# Altium footprint library LED.PcbLib: 60 footprints (part 4 of 4)
Each footprint in its own frame and in the unit in brackets; x right, y up, seen from the top. Pads: shape width x height; smd on the part's side, far side on the other; paste and mask are expansions set on the pad; w line width, h text height; cw(c..) or ccw(c..) is an arc to the next point about the centre after c.
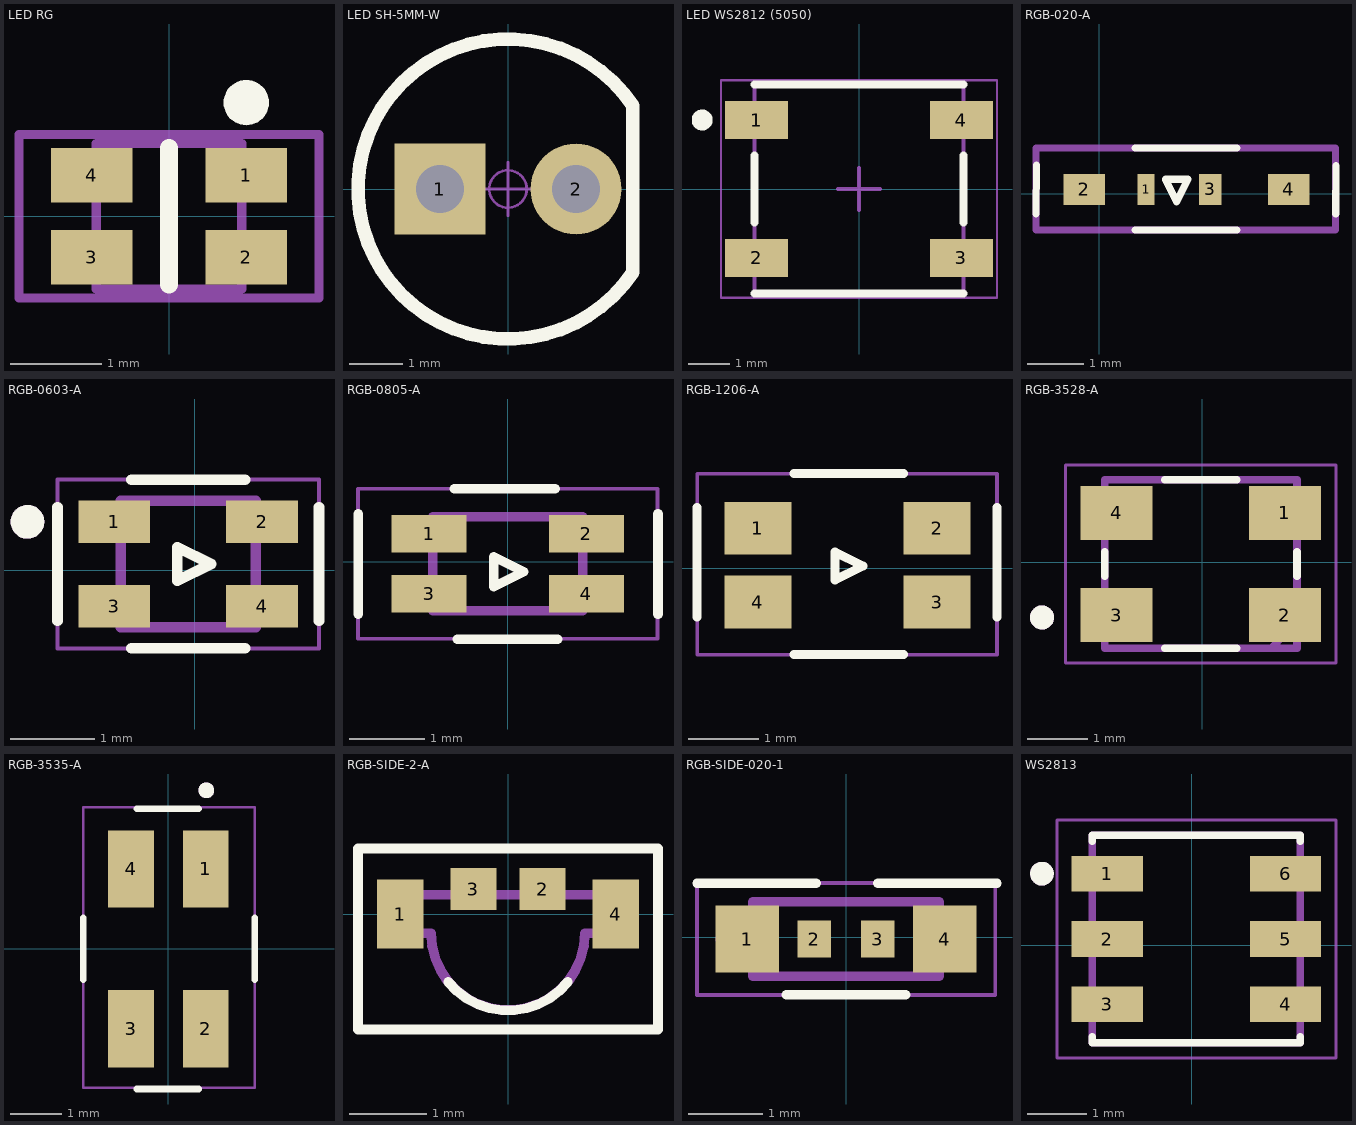
[diagram p3: the footprints below, top view; thin cyan lines are the x and y axes]

## LED RG [mm]
pads (5):
  rect 0.9x0.6 smd: 1(0.85,0.45) 2(0.85,-0.45) 3(-0.85,-0.45) 4(-0.85,0.45)
  round 0.5 on Top Overlay: ""(0.85,1.25)
Top Overlay:
  lines w0.2: 0,-0.75 0,0.75
Mechanical 1:
  lines w0.1: -0.8,0.8 0.8,0.8 ; -0.8,0.8 -0.8,-0.8 0.8,-0.8 ; -0.8,0.8 -0.8,0.8 ; 0.8,-0.8 0.8,0.8 ; 0.8,-0.8 0.8,-0.8 ; 0.8,0.8 0.8,0.8
Mechanical 15:
  lines w0.1: -1.65,-0.9 1.65,-0.9 1.65,0.9 -1.65,0.9 -1.65,-0.9
3D body "User Library-LED_0603_R.STEP": height 0.55, standoff -0.05, extent -0.8,0 0.8,0.8
3D body "User Library-LED_0603_B.STEP": height 0.55, standoff -0.05, extent -0.8,-0.8 0.8,0

## LED SH-5MM-W [mm] "ï¿½ï¿½É«5mmï¿½ï¿½Ã±ï¿½ï¿½Ö±ï¿½ï¿½LED"
height 10.16
pads (2):
  rect 1.7x1.7 hole 0.9: 1(-1.27,0)
  round 1.7 hole 0.9: 2(1.27,0)
Top Overlay:
  lines w0.254: 2.33,-1.553 cw(c0,0) 2.33,1.553 2.33,-1.553
Mechanical 15:
  circle w0.05: c0,0 r0.35
  lines w0.05: -0.5,0 0.5,0 ; 0,-0.5 0,0.5
3D body "LED-4.8mm������.STEP": height 4.85, standoff 0.05, extent -2.75,-2.75 2.41,2.75
3D body "LED-4.8mm.STEP": height 3.42, standoff -3.45, extent -1.584,-0.745 1.535,0.755

## LED WS2812 (5050) [mm]
pads (4):
  rect 1.5x0.9 smd: 1(-2.45,1.65) 2(-2.45,-1.65) 3(2.45,-1.65) 4(2.45,1.65)
Top Overlay:
  circle w0.25: c-3.75,1.65 r0.125
  lines w0.2: -2.5,-2.5 2.5,-2.5 ; -2.5,-0.8 -2.5,0.8 ; -2.5,2.5 2.5,2.5 ; 2.5,-0.8 2.5,0.8
Mechanical 13:
  lines w0.1: -2.5,-2.5 -2.5,2.5 2.5,2.5 2.5,-2.5 -2.5,-2.5
Mechanical 15:
  lines w0.05: -3.3,-2.6 3.3,-2.6 3.3,2.6 -3.3,2.6 -3.3,-2.598
  lines w0.1: -0.5,0 0.5,0 ; 0,-0.5 0,0.5
3D body "User Library-WS2812B.STEP": height 1.69, standoff -0.01, extent -2.7,-2.5 2.7,2.5

## RGB-020-A [mm]
pads (4):
  rect 0.3x0.55 smd: 1(0.838,0.077)
  rect 0.74x0.55 smd: 2(-0.263,0.077) 4(3.382,0.077)
  rect 0.4x0.55 smd: 3(1.978,0.077)
Top Overlay:
  lines w0.127: -1.124,-0.359 -1.118,0.51 ; 0.64,-0.65 2.454,-0.65 ; 0.64,0.817 2.454,0.817 ; 4.218,-0.365 4.223,0.505 ; 1.181,0.257 1.381,-0.143 1.581,0.257 1.181,0.257
Mechanical 1:
  lines w0.127: 4.217,0.807 4.217,-0.65 -1.124,-0.65 -1.124,0.817 4.217,0.817
Mechanical 15:
  lines w0.127: 4.217,0.807 4.217,-0.65 -1.124,-0.65 -1.124,0.817 4.217,0.817

## RGB-0603-A [mm]
pads (4):
  rect 0.85x0.5 smd: 1(-0.951,0.576) 2(0.799,0.576) 3(-0.951,-0.424) 4(0.799,-0.424)
Top Overlay:
  circle w0.2: c-1.981,0.576 r0.1
  lines w0.127: -1.626,-0.597 -1.626,0.749 ; -0.749,-0.924 0.597,-0.924 ; -0.749,1.076 0.597,1.076 ; 1.474,-0.597 1.474,0.749 ; -0.206,-0.124 0.194,0.076 -0.206,0.276 -0.206,-0.124
Mechanical 13:
  circle w0.2: c-1.981,0.576 r0.1
  lines w0.127: -0.876,-0.674 -0.876,0.826 0.724,0.826 0.724,-0.674 -0.876,-0.674
Mechanical 15:
  lines w0.05: -1.626,-0.924 -1.626,1.076 1.474,1.076 1.474,-0.924 -1.626,-0.924
3D body "QBLP600-RGB--3DModel-STEP-56544.STEP": height 0.8, standoff 0, extent -0.876,-0.674 0.724,0.826

## RGB-0805-A [mm]
pads (4):
  rect 1x0.5 smd: 1(-1.05,0.375) 2(1.05,0.375) 3(-1.05,-0.425) 4(1.05,-0.425)
Top Overlay:
  lines w0.127: -1.993,-0.702 -1.993,0.644 ; -0.711,0.975 0.635,0.975 ; -0.676,-1.032 0.67,-1.032 ; 2.007,-0.702 2.007,0.644 ; -0.186,-0.331 -0.186,0.069 0.214,-0.131 -0.186,-0.331
Mechanical 13:
  lines w0.127: -1,-0.65 -1,0.6 1,0.6 1,-0.65 -1,-0.65
Mechanical 15:
  lines w0.05: -2,-1.025 2,-1.025 2,0.975 -2,0.975 -2,-1.025
3D body "OSTB0805C1C-A--3DModel-STEP-1.STEP": height 1.2, standoff 0, extent -0.986,-0.656 1.014,0.594

## RGB-1206-A [mm]
pads (4):
  rect 0.95x0.75 smd: 1(1.176,0.57) 2(3.726,0.57) 3(3.726,-0.48) 4(1.176,-0.48)
Top Overlay:
  lines w0.127: 0.307,-0.691 0.308,0.869 ; 1.691,-1.226 3.251,-1.227 ; 1.691,1.352 3.251,1.351 ; 4.579,-0.691 4.58,0.869 ; 2.27,-0.167 2.67,0.033 2.27,0.233 2.27,-0.167
Mechanical 15:
  lines w0.05: 0.308,-1.227 0.308,1.351 4.58,1.351 4.58,-1.227 0.308,-1.227

## RGB-3528-A [mm]
pads (4):
  rect 1.2x0.9 smd: 1(1.375,0.825) 2(1.375,-0.875) 3(-1.425,-0.875) 4(-1.425,0.825)
Top Overlay:
  circle w0.2: c-2.667,-0.914 r0.1
  lines w0.127: -1.625,-0.225 -1.625,0.175 ; -0.625,-1.425 0.575,-1.425 ; -0.625,1.375 0.575,1.375 ; 1.575,-0.225 1.575,0.175
Mechanical 13:
  circle w0.2: c-2.667,-0.914 r0.1
  lines w0.127: 1.145,-1.425 1.575,-1.425 1.575,-0.985 ; 1.145,-1.425 -1.625,-1.425 -1.625,1.375 1.575,1.375 1.575,-0.985 ; 1.145,-1.425 1.575,-0.985
Mechanical 15:
  lines w0.05: -2.275,-1.675 -2.275,1.625 2.225,1.625 2.225,-1.675 -2.275,-1.675
3D body "LL-R3528RGBC-008-B--3DModel-STEP-56544.STEP": height 2.1, standoff 0, extent -1.801,-1.451 1.699,1.349

## RGB-3535-A [mil]
pads (4):
  rect 35x59 smd: 1(28.5,61) 2(28.5,-61) 3(-28.5,-61) 4(-28.5,61)
Top Overlay:
  circle w10: c29,121 r1
  lines w5: -65,-23.62 -65,23.62 ; -24.16,-107 23.08,-107 ; -24.16,107 23.08,107 ; 65.92,-23.62 65.92,23.62
Mechanical 1:
  circle w10: c29,121 r1
Mechanical 15:
  lines w1.97: -65,-106 -65,108 65.92,108 65.92,-106 -65,-106
3D body "SMP4-RGB.STEP": height 73, standoff 0, extent -54,-67 56,71

## RGB-SIDE-2-A [mm]
pads (4):
  rect 0.6x0.9 smd: 1(-1.4,0) 4(1.4,0)
  rect 0.6x0.55 smd: 2(0.45,0.325) 3(-0.45,0.325)
Top Overlay:
  lines w0.127: -0.777,-0.884 ccw(c0,-0.254) 0.777,-0.884 ; -1.95,-1.5 -1.95,0.85 1.95,0.85 1.95,-1.5 -1.95,-1.5
Mechanical 13:
  lines w0.127: -1.6,-0.25 -1,-0.25 ccw(c0,-0.25) 1,-0.25 1.6,-0.25 1.6,0.25 -1.6,0.25 -1.6,-0.25
3D body "IN-S126TASRGB--3DModel-STEP-56544.STEP": height 1, standoff 0, extent -1.651,-1.309 1.549,0.191

## RGB-SIDE-020-1 [mm]
pads (4):
  rect 0.85x0.9 smd: 1(-1.325,-0.025) 4(1.325,-0.025)
  rect 0.45x0.5 smd: 2(-0.425,-0.025) 3(0.425,-0.025)
Top Overlay:
  lines w0.127: -2,0.725 -0.4,0.725 ; -0.8,-0.775 0.8,-0.775 ; 0.425,0.725 2.025,0.725
Mechanical 13:
  circle w0.2: c-1.55,-0.025 r0.1
  lines w0.127: -1.25,-0.525 1.25,-0.525 1.25,0.475 -1.25,0.475 -1.25,-0.525
Mechanical 15:
  lines w0.05: -2,-0.775 2,-0.775 2,0.725 -2,0.725 -2,-0.775

## WS2813 [mm]
pads (6):
  rect 1.2x0.6 smd: 1(-1.424,1.202) 2(-1.424,0.102) 3(-1.424,-0.998) 4(1.576,-0.998) 5(1.576,0.102) 6(1.576,1.202)
Top Overlay:
  circle w0.2: c-2.524,1.202 r0.1
  lines w0.127: -1.674,-1.548 -1.674,-1.648 1.826,-1.648 1.826,-1.548 ; -1.674,1.752 -1.674,1.852 1.826,1.852 1.826,1.752
Mechanical 13:
  circle w0.2: c-2.524,1.202 r0.1
  lines w0.127: -1.674,-1.648 1.826,-1.648 ; -1.674,-1.648 1.826,-1.648 ; -1.674,-1.648 -1.674,1.852 1.826,1.852 1.826,-1.648
Mechanical 15:
  lines w0.05: -2.274,-1.898 2.426,-1.898 2.426,2.102 -2.274,2.102 -2.274,-1.898
3D body "WS2813-MINI--3DModel-STEP-56544.STEP": height 0.95, standoff 0, extent -1.674,-1.648 1.826,1.852